# Altium footprint library PBL - THD Packages.PcbLib: 256 footprints (part 11 of 16)
Each footprint in its own frame and in the unit in brackets; x right, y up, seen from the top. Pads: shape width x height; smd on the part's side, far side on the other; paste and mask are expansions set on the pad; w line width, h text height; cw(c..) or ccw(c..) is an arc to the next point about the centre after c.
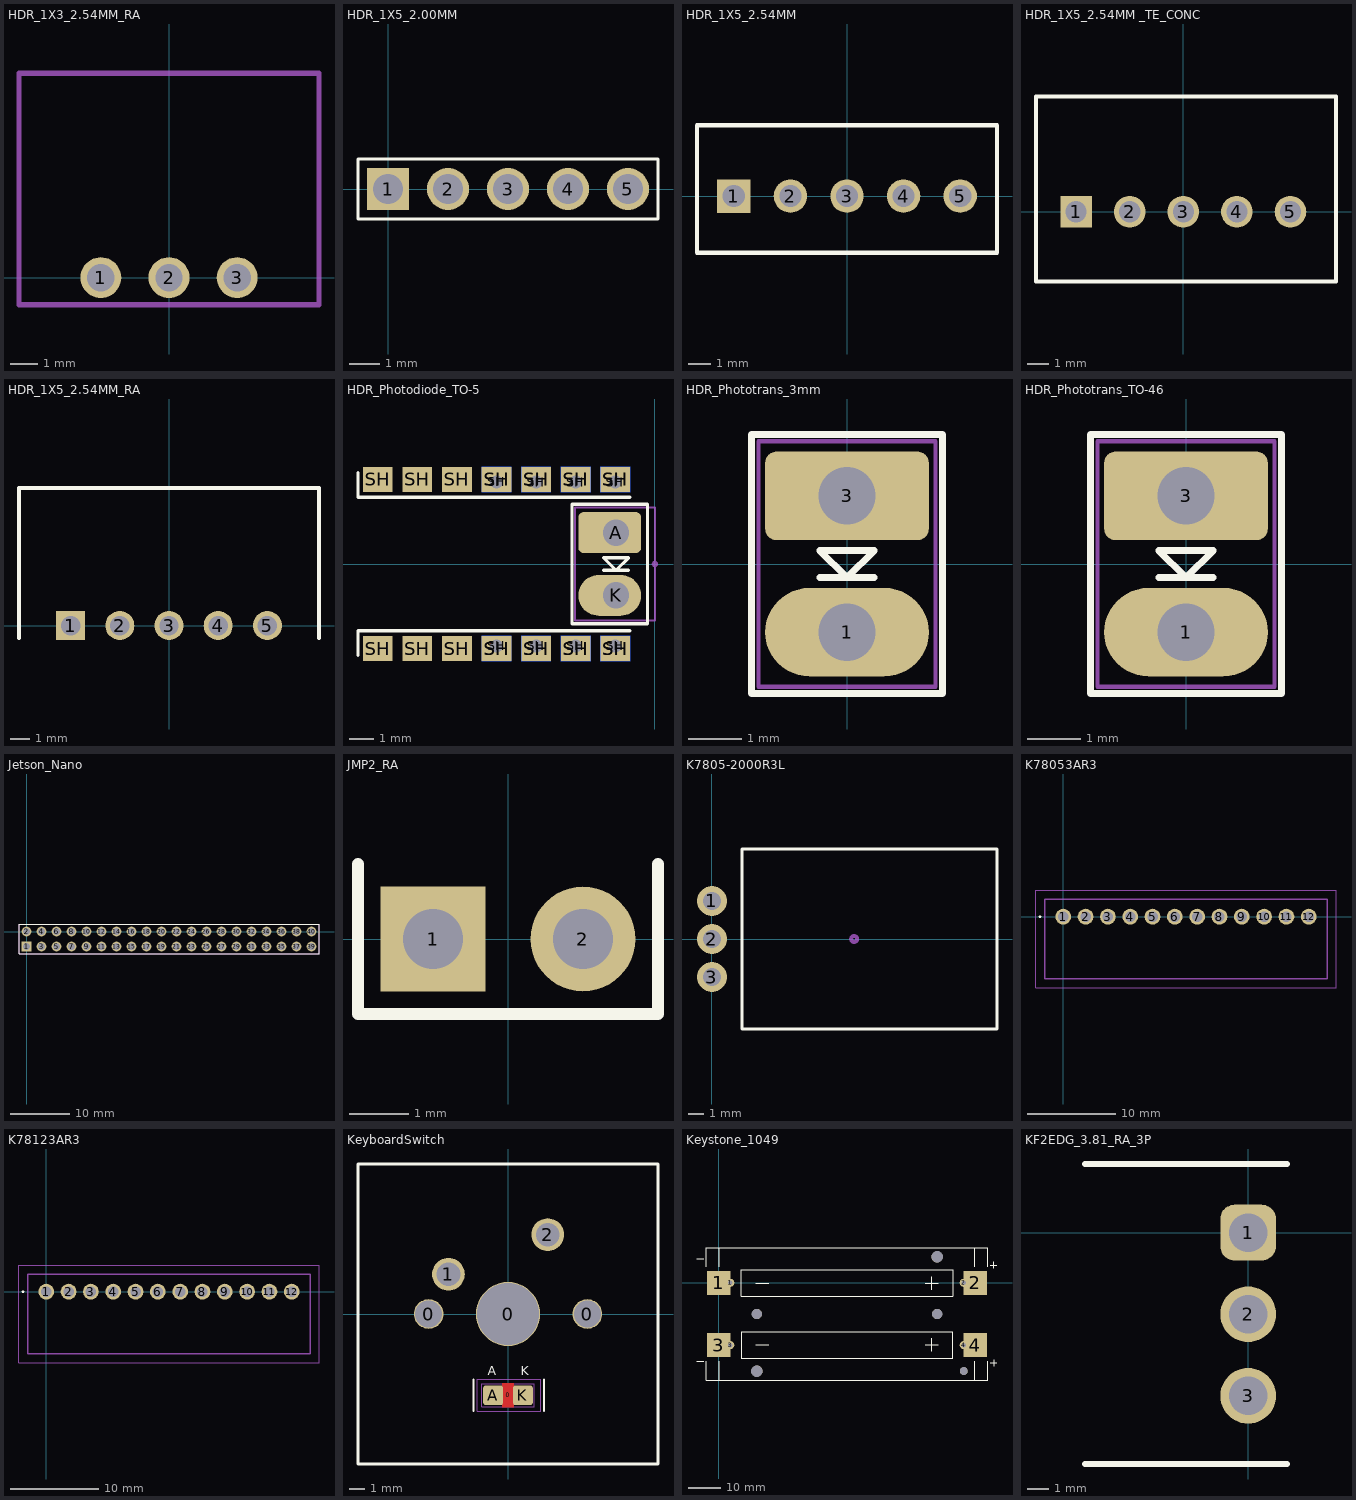
[diagram p10: the footprints below, top view; thin cyan lines are the x and y axes]

## HDR_1X3_2.54MM_RA [mm] "3 position right angled 2.54 pitch"
pads (3):
  round 1.5 hole 1 mask+0.102: 1(-2.5,0) 2(0,0) 3(2.5,0)
Mechanical 3:
  lines w0.2: -5.5,-1 5.5,-1 5.5,7.5 -5.5,7.5 -5.5,-1
3D body "Header 3 pin.STEP": height 5.95, standoff -2.55, extent -5.08,-0.2 5.08,7

## HDR_1X5_2.00MM [mm] "5 position striaght 2mm pitch"
pads (5):
  rect 1.4x1.4 hole 1 mask+0.102: 1(0,0)
  round 1.4 hole 1 mask+0.102: 2(2,0) 3(4,0) 4(6,0) 5(8,0)
Top Overlay:
  lines w0.1: -1,-1 9,-1 9,1 -1,1 -1,-1
3D body "pin header 1x5 pitch 2mm heigth 5mm.stp": height 6.06, standoff -2.64, extent -1,-1 9,1

## HDR_1X5_2.54MM [mm] "5 position striaght 2.54 pitch"
pads (5):
  rect 1.5x1.5 hole 1 mask+0.102: 1(-5.08,0)
  round 1.5 hole 1 mask+0.102: 2(-2.54,0) 3(0,0) 4(2.54,0) 5(5.08,0)
Top Overlay:
  lines w0.2: -6.731,-2.54 -6.731,3.175 6.731,3.175 6.731,-2.54 -6.731,-2.54
3D body "Pin Header 1x5 TH Pitch 2.54mm.stp": height 9.5, standoff -3.2, extent -6.35,-1.27 6.35,1.27

## HDR_1X5_2.54MM _TE_CONC [mm] "5 position striaght 2.54 pitch"
pads (5):
  rect 1.5x1.5 hole 1 mask+0.102: 1(-5.08,0)
  round 1.5 hole 1 mask+0.102: 2(-2.54,0) 3(0,0) 4(2.54,0) 5(5.08,0)
Top Overlay:
  lines w0.2: -6.985,-3.302 -6.985,5.461 7.239,5.461 7.239,-3.302 -6.985,-3.302
3D body "Pin Header 1x5 TH Pitch 2.54mm.stp": height 9.5, standoff -3.2, extent -6.35,-1.27 6.35,1.27

## HDR_1X5_2.54MM_RA [mm] "5 position right angled 2.54 pitch"
pads (5):
  rect 1.5x1.5 hole 1 mask+0.102: 1(-5.08,0)
  round 1.5 hole 1 mask+0.102: 2(-2.54,0) 3(0,0) 4(2.54,0) 5(5.08,0)
Top Overlay:
  lines w0.2: -7.747,-0.635 -7.747,7.112 7.747,7.112 7.747,-0.635
3D body "Header 5 pin.STEP": height 5.95, standoff -2.55, extent -7.62,-0.298 7.62,6.902

## HDR_Photodiode_TO-5 [mil] "Photodiode TO-5 form, edge straddling"
height 525
pads (33):
  round 10 on Mech15: 0(0,0)
  rrect25% 100x65 hole 42 copper offset -10,0: A(-61.81,50)
  oval 100x65 hole 42 copper offset -10,0: K(-61.81,-50)
  rect 47.24x40 smd: SH(-440.94,-134.49) SH(-440.94,134.5) SH(-377.95,-134.5) SH(-377.95,134.49) SH(-314.96,-134.5) SH(-314.96,134.49) SH(-251.97,-134.49) SH(-251.97,134.51) SH(-188.98,-134.49) SH(-188.98,134.5) SH(-125.99,-134.49) SH(-125.99,134.5) SH(-63,-134.49) SH(-63,134.5)
  rect 47.24x40 smd far side: SH(-251.97,-134.49) SH(-251.97,134.51) SH(-188.98,-134.49) SH(-188.98,134.5) SH(-125.99,-134.49) SH(-125.99,134.5) SH(-63,-134.49) SH(-63,134.5)
  round 32 hole 20: SH(-251.97,-130.49) SH(-251.97,130.51) SH(-188.98,-130.49) SH(-188.98,130.5) SH(-125.99,-130.49) SH(-125.99,130.5) SH(-63,-130.49) SH(-63,130.5)
Top Overlay:
  lines w5: -472.44,-145.66 -472.44,-106.29 -39.37,-106.29 ; -472.44,145.67 -472.44,106.3 -39.37,106.3 ; -81.81,-10 -41.81,-10 ; -131.81,-95 -11.81,-95 -11.81,95 -131.81,95 -131.81,-95 ; -81.81,10 -61.81,-10 -41.81,10 -81.81,10
13 - 3D Top Side:
  lines w3: -126.81,-90 0,-90 0,90 -126.81,90 -126.81,-90
3D body "TO-5 custom with shield.stp": height 109.1, standoff -172.1, extent -444.88,-140.32 86.62,140.32

## HDR_Phototrans_3mm [mil] "LED 3mm dia lens, 0.100\" pitch"
height 525
pads (2):
  oval 120x65 hole 42: 1(0,-50)
  rrect25% 120x65 hole 42: 3(0,50)
Top Overlay:
  lines w5: -20,-10 20,-10 ; -70,-95 -70,95 70,95 70,-95 -70,-95 ; -20,10 20,10 0,-10 -20,10
13 - 3D Top Side:
  lines w3: -65,-90 -65,90 65,90 65,-90 -65,-90
3D body "LED_3mm_T1.stp": height 31, standoff -94.49, extent -249.2,-62.86 516.54,62.87

## HDR_Phototrans_TO-46 [mil] "LED TO-46 form, edge straddling"
height 525
pads (2):
  oval 120x65 hole 42: 1(0,-50)
  rrect25% 120x65 hole 42: 3(0,50)
Top Overlay:
  lines w5: -20,-10 20,-10 ; -70,-95 70,-95 70,95 -70,95 -70,-95 ; -20,10 0,-10 20,10 -20,10
13 - 3D Top Side:
  lines w3: -65,-90 65,-90 65,90 -65,90 -65,-90
3D body "TO-46 Edge straddling.stp": height 77.29, standoff -150.51, extent -8.99,-119.01 546.86,108.79

## Jetson_Nano [mm] "Jetson nano 40pin gpio header"
pads (40):
  rect 1.64x1.64 hole 1.11: 1(0,-2.54)
  round 1.64 hole 1.11: 2(0,0) 3(2.54,-2.54) 4(2.54,0) 5(5.08,-2.54) 6(5.08,0) 7(7.62,-2.54) 8(7.62,0) 9(10.16,-2.54) 10(10.16,0) 11(12.7,-2.54) 12(12.7,0) 13(15.24,-2.54) 14(15.24,0) 15(17.78,-2.54) 16(17.78,0) 17(20.32,-2.54) 18(20.32,0) 19(22.86,-2.54) 20(22.86,0) 21(25.4,-2.54) 22(25.4,0) 23(27.94,-2.54) 24(27.94,0) 25(30.48,-2.54) 26(30.48,0) 27(33.02,-2.54) 28(33.02,0) 29(35.56,-2.54) 30(35.56,0) 31(38.1,-2.54) 32(38.1,0) 33(40.64,-2.54) 34(40.64,0) 35(43.18,-2.54) 36(43.18,0) 37(45.72,-2.54) 38(45.72,0) 39(48.26,-2.54) 40(48.26,0)
Top Overlay:
  lines w0.1: -1.27,-3.745 49.53,-3.745 49.53,1.205 -1.27,1.205 -1.27,-3.745
13 - 3D Top Side:
  lines w0.2: -1.27,-3.745 -1.27,1.205 49.53,1.205 49.53,-3.745 -1.27,-3.745
3D body "Jetson nano 4GB.step": height 8.28, standoff -22.22, extent -23.8,-11.2 57.222,88.8

## JMP2_RA [mil] "2-pin RA jumper, 0.1\" .025 pins"
height 98.43
pads (2):
  rect 70x70 hole 40: 1(-50,0)
  round 70 hole 40: 2(50,0)
Top Overlay:
  lines w8: -100,50 -100,-50 100,-50 100,50
3D body "Hdr, 2-pin RA.step": height 98.43, standoff -129.94, extent -100,-12.5 100,393.7

## K7805-2000R3L [mm] "K7805 module from mousun, right angle mounting"
pads (3):
  round 2 hole 1.2: 1(0,2.54) 2(0,0) 3(0,-2.54)
Top Overlay:
  lines w0.2: 2,-6 19.05,-6 19.05,6 2,6 2,-6
Top Component Center:
  circle w0.254: c9.5,0 r0.2
3D body: height 9, standoff 0.2, extent 2,-6 19,6

## K78053AR3 [mm]
pads (12):
  round 1.8 hole 1.2: 1(0,0) 2(2.54,0) 3(5.08,0) 4(7.62,0) 5(10.16,0) 6(12.7,0) 7(15.24,0) 8(17.78,0) 9(20.32,0) 10(22.86,0) 11(25.4,0) 12(27.94,0)
Top Overlay:
  lines w0.2: -2.7,0 ccw(c-2.65,0) -2.6,0 ; -2.7,0 cw(c-2.65,0) -2.6,0 ; -2.7,0 ccw(c-2.65,0) -2.6,0
13 - 3D Top Side:
  lines w0.2: -2.105,-7.07 30.045,-7.07 30.045,1.98 -2.105,1.98 -2.105,-7.07
15 - Top Courtyards:
  lines w0.1: -3.105,-8.07 31.045,-8.07 31.045,2.98 -3.105,2.98 -3.105,-8.07
3D body "K7805-3AR3.stp": height 15.45, standoff -5, extent -2.105,-7.07 30.045,1.98

## K78123AR3 [mm]
pads (12):
  round 1.8 hole 1.2: 1(0,0) 2(2.54,0) 3(5.08,0) 4(7.62,0) 5(10.16,0) 6(12.7,0) 7(15.24,0) 8(17.78,0) 9(20.32,0) 10(22.86,0) 11(25.4,0) 12(27.94,0)
Top Overlay:
  lines w0.2: -2.7,0 ccw(c-2.65,0) -2.6,0 ; -2.7,0 cw(c-2.65,0) -2.6,0 ; -2.7,0 ccw(c-2.65,0) -2.6,0
13 - 3D Top Side:
  lines w0.2: -2.105,-7.07 30.045,-7.07 30.045,1.98 -2.105,1.98 -2.105,-7.07
15 - Top Courtyards:
  lines w0.1: -3.105,-8.07 31.045,-8.07 31.045,2.98 -3.105,2.98 -3.105,-8.07
3D body "K7805-3AR3.stp": height 15.45, standoff -5, extent -2.105,-7.07 30.045,1.98

## KeyboardSwitch [mm]
pads (8):
  round 1.9 hole 1.72: 0(-5.08,0) 0(5.08,0)
  round 0.508 on Mech15: 0(0,-5.2)
  round 4.1 hole 3.98: 0(0,0)
  round 2.1 hole 1.51: 1(-3.81,2.54) 2(2.54,5.08)
  rrect25% 1.27x1.27 smd: A(-0.953,-5.2) K(0.953,-5.2)
Top Layer:
  pour cut-out: -0.381,-4.438 0.381,-4.438 0.381,-5.962 -0.381,-5.962
Top Overlay:
  lines w0.127: -2.2,-6.2 -2.2,-4.2 ; 2.3,-6.2 2.3,-4.2
  lines w0.2: -9.6,-9.6 -9.6,9.6 9.6,9.6 9.6,-9.6 -9.6,-9.6
  text "A" at -1.3,-4.1 h1
  text "K" at 0.8,-4.1 h1
13 - 3D Top Side:
  lines w0.076: -1.689,-5.937 -1.689,-4.463 1.689,-4.463 1.689,-5.937 -1.689,-5.937
15 - Top Courtyards:
  lines w0.076: -1.968,-6.216 -1.968,-4.184 2.095,-4.184 2.095,-6.216 -1.968,-6.216
3D body: height 0.1, standoff 0, extent -0.3,-5.6 0.3,-4.8
3D body: height 0.1, standoff 0, extent -1,-5.825 1,-4.575
3D body: height 0.3, standoff 0.1, extent -1,-5.825 1,-4.575
3D body: height 0.8, standoff 0.3, extent -0.673,-5.825 0.728,-4.575

## Keystone_1049 [mm] "Dual 18650 Lipo battery holder"
pads (13):
  rect 7.341x7.341 smd: 1(-0.024,-0.006) 2(78.64,-0.006) 3(-0.024,-19.132) 4(78.64,-19.132)
  round 2.5 hole 1.4: 1(3.5,0) 2(75.1,0) 3(3.5,-19.1) 4(75.1,-19.1)
  round 3.454 hole 3.55 unplated: ""(11.686,-27.082) ""(66.931,7.944)
  round 3.175 hole 3.18 unplated: ""(11.686,-9.569) ""(66.931,-9.569)
  round 2.388 hole 2.38 unplated: ""(75.135,-27.082)
Top Overlay:
  lines w0.254: -6.692,-24.047 -4.692,-24.047 ; -6.692,7.431 -4.692,7.431 ; -3.872,-24.047 -3.872,-29.889 39.308,-29.889 ; -3.872,4.909 -3.872,10.751 39.308,10.751 ; 0.128,-24.047 0.128,-29.889 39.308,-29.889 ; 0.128,4.909 0.128,10.751 39.308,10.751 ; 78.488,-24.047 78.488,-29.889 39.308,-29.889 ; 78.488,4.909 78.488,10.751 39.308,10.751 ; 82.488,-24.047 82.488,-29.889 39.308,-29.889 ; 82.488,4.909 82.488,10.751 39.308,10.751 ; 83.308,-24.569 85.308,-24.569 ; 83.308,5.431 85.308,5.431 ; 84.308,-25.569 84.308,-23.569 ; 84.308,4.431 84.308,6.431 ; 6.808,-23.069 39.308,-23.069 ; 6.808,-23.069 6.808,-15.069 ; 6.808,-23.069 39.308,-23.069 ; 6.808,-23.069 6.808,-15.069 ; 6.808,-15.069 39.308,-15.069 ; 6.808,-15.069 39.308,-15.069 ; 6.808,-4.069 6.808,3.931 ; 6.808,-4.069 39.308,-4.069 ; 6.808,-4.069 6.808,3.931 ; 6.808,-4.069 39.308,-4.069 ; 6.808,3.931 39.308,3.931 ; 6.808,3.931 39.308,3.931 ; 39.308,-23.069 71.808,-23.069 ; 39.308,-23.069 71.808,-23.069 ; 39.308,-15.069 71.808,-15.069 ; 39.308,-15.069 71.808,-15.069 ; 39.308,-4.069 71.808,-4.069 ; 39.308,-4.069 71.808,-4.069 ; 39.308,3.931 71.808,3.931 ; 39.308,3.931 71.808,3.931 ; 71.808,-23.069 71.808,-15.069 ; 71.808,-23.069 71.808,-15.069 ; 71.808,-4.069 71.808,3.931 ; 71.808,-4.069 71.808,3.931
  lines w0.381: 65.308,-2.069 65.308,1.931 ; 11.308,-19.069 15.308,-19.069 11.308,-19.069 ; 11.308,-0.069 15.308,-0.069 11.308,-0.069 ; 63.308,-19.069 67.308,-19.069 63.308,-19.069 ; 63.308,-0.069 67.308,-0.069 63.308,-0.069 ; 65.308,-21.069 65.308,-17.069 65.308,-21.069
3D body "keystone-PN1049P.STEP": height 14.92, standoff -3.54, extent 0.78,-29.394 77.836,10.382
3D body "keystone-PN1048.STEP": height 14.92, standoff -3.42, extent -3.547,-29.545 82.407,10.231

## KF2EDG_3.81_RA_3P [mm] "KF2EDG 3.81mm screw connector, RA, 3 position"
pads (3):
  rrect50% 2.6x2.6 hole 1.8: 1(0,0)
  round 2.6 hole 1.8: 2(0,-3.81) 3(0,-7.62)
Top Overlay:
  lines w0.3: -7.6,-10.8 1.4,-10.8 1.8,-10.8 ; -7.6,3.2 1.8,3.2
3D body "User Library-KEFA 3_81mm_3pin_RA.STEP": height 8.08, standoff -3.2, extent -17,-10.22 1.4,2.6